# Altium integrated library 方林_Library.IntLib: 138 symbols (part 1 of 2)
Pins are listed as number, name and electrical type; pins without a type are passive.

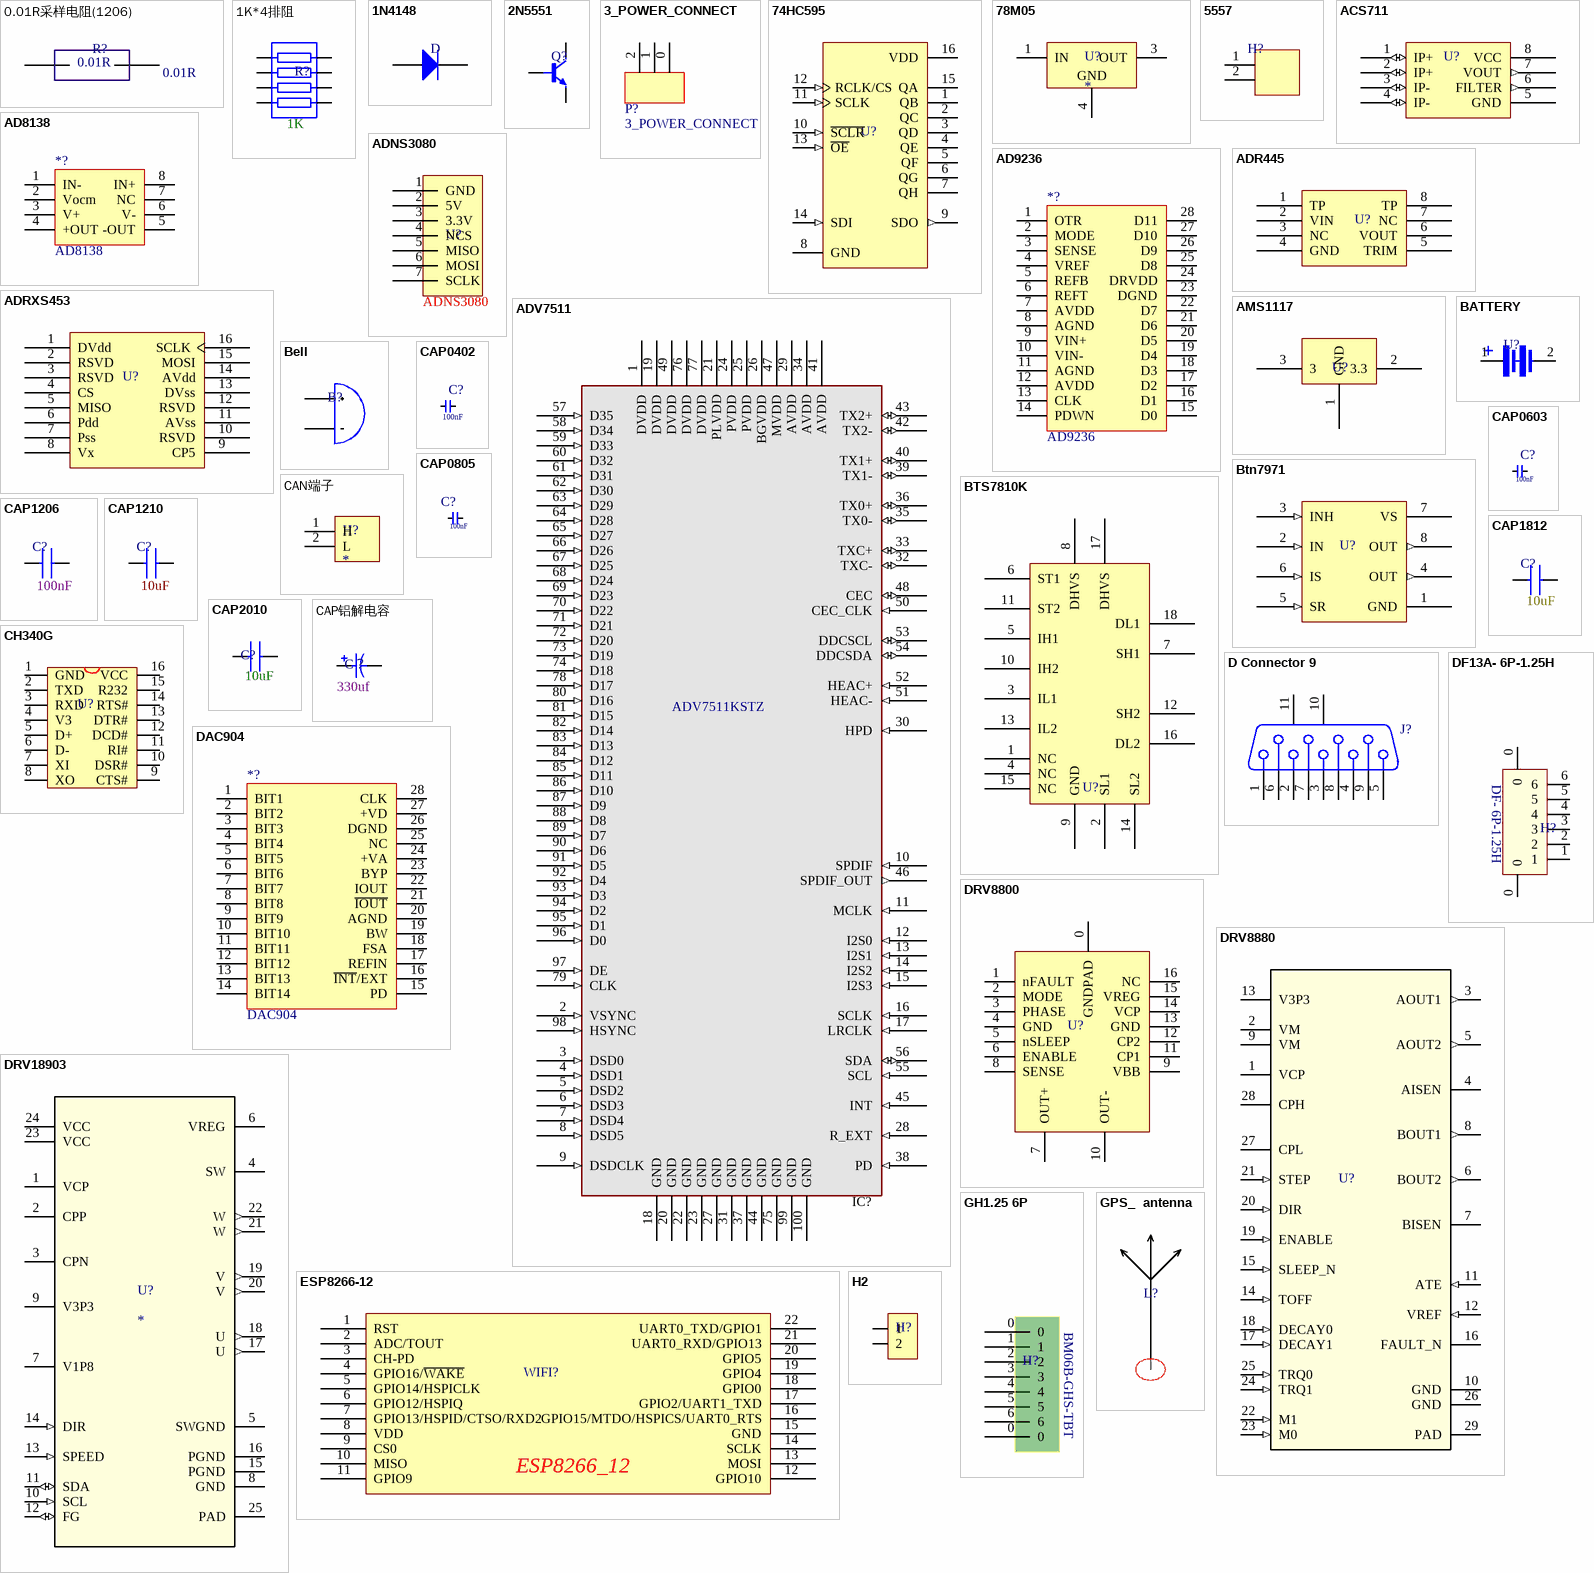
[diagram p0: symbols 0.01R采样电阻(1206) to H2]

## 0.01R采样电阻(1206)
designator R?  value 0.01R  (hidden comment: *)
采样电阻
footprint CAP1206
pins: 1, 2

## 1K*4排阻
designator R?  value 1K  (hidden comment: *)
footprint 1K*4排阻
pins: 1, 2, 3, 4, 5, 6, 7, 8

## 1N4148
designator D  (value not drawn)
footprint 1N4148
pins: 1 A, 2 K

## 2N5551
designator Q?  (value not drawn)
NPN三极管
footprint 2N5551
pins: 1 b, 2 e, 3 c

## 3_POWER_CONNECT
designator P?
footprint 4 pin white
pins: 0, 1, 2

## 74HC595
designator U?  (value not drawn)
锁存器
footprint TSSOP16
pins: 1 QB (hiz), 2 QC (hiz), 3 QD (hiz), 4 QE (hiz), 5 QF (hiz), 6 QG (hiz), 7 QH (hiz), 8 GND (power), 9 SDO (out), 10 ~{SCLR} (in), 11 SCLK (in), 12 RCLK/CS (in), 13 ~{OE} (in), 14 SDI (in), 15 QA (hiz), 16 VDD (power)

## 78M05
designator U?
5V稳压
footprint D-PAK
pins: 1 IN (power), 3 OUT (power), 4 GND (power)

## 5557
designator H?  (value not drawn)
footprint 5557
pins: 1, 2

## ACS711
designator U?  (value not drawn)
霍尔电流采样
footprint SOIC-NB-8
pins: 1 IP+ (io), 2 IP+ (io), 3 IP- (io), 4 IP- (io), 5 GND (power), 6 FILTER (out), 7 VOUT (out), 8 VCC (power)

## AD8138
designator *?
footprint SO-8
pins: 1 IN-, 2 Vocm, 3 V+, 4 +OUT, 5 -OUT, 6 V-, 7 NC, 8 IN+

## AD9236
designator *?
footprint SSOP-28 (FT232)
pins: 1 OTR, 2 MODE, 3 SENSE, 4 VREF, 5 REFB, 6 REFT, 7 AVDD, 8 AGND, 9 VIN+, 10 VIN-, 11 AGND, 12 AVDD, 13 CLK, 14 PDWN, 15 D0, 16 D1, 17 D2, 18 D3, 19 D4, 20 D5, 21 D6, 22 D7, 23 DGND, 24 DRVDD, 25 D8, 26 D9, 27 D10, 28 D11

## ADNS3080
designator U?  (value not drawn)
光流
footprint ADNS3080 (光流)
pins: 1 GND, 2 5V, 3 3.3V, 4 NCS, 5 MISO, 6 MOSI, 7 SCLK

## ADR445
designator U?  (value not drawn)
footprint SOIC-8
pins: 1 TP, 2 VIN, 3 NC, 4 GND, 5 TRIM, 6 VOUT, 7 NC, 8 TP

## ADRXS453
designator U?  (value not drawn)
footprint ADRXS453
pins: 1 DVdd, 2 RSVD, 3 RSVD, 4 CS, 5 MISO, 6 Pdd, 7 Pss, 8 Vx, 9 CP5, 10 RSVD, 11 AVss, 12 RSVD, 13 DVss, 14 AVdd, 15 MOSI, 16 SCLK

## ADV7511
designator IC?, comment ADV7511KSTZ
Low-Power HDMI Transmitter with Audio Return Channel; Manufacturer: Analog Devices; Value: 225MHz; DPN: *
footprint LQFP_100P
pins: 1 DVDD (power), 2 VSYNC (in), 3 DSD0 (in), 4 DSD1 (in), 5 DSD2 (in), 6 DSD3 (in), 7 DSD4 (in), 8 DSD5 (in), 9 DSDCLK (in), 10 SPDIF (in), 11 MCLK (in), 12 I2S0 (in), 13 I2S1 (in), 14 I2S2 (in), 15 I2S3 (in), 16 SCLK (in), 17 LRCLK (in), 18 GND (power), 19 DVDD (power), 20 GND (power), 21 PLVDD (power), 22 GND (power), 23 GND (power), 24 PVDD (power), 25 PVDD (power), 26 BGVDD (power), 27 GND (power), 28 R_EXT (in), 29 AVDD (power), 30 HPD (in), 31 GND (power), 32 TXC- (io), 33 TXC+ (io), 34 AVDD (power), 35 TX0- (io), 36 TX0+ (io), 37 GND (power), 38 PD (in), 39 TX1- (io), 40 TX1+ (io), 41 AVDD (power), 42 TX2- (io), 43 TX2+ (io), 44 GND (power), 45 INT (in), 46 SPDIF_OUT (out), 47 MVDD (power), 48 CEC (io), 49 DVDD (power), 50 CEC_CLK (in), 51 HEAC- (in), 52 HEAC+ (in), 53 DDCSCL (io), 54 DDCSDA (io), 55 SCL (in), 56 SDA (io), 57 D35 (in), 58 D34 (in), 59 D33 (in), 60 D32 (in), 61 D31 (in), 62 D30 (in), 63 D29 (in), 64 D28 (in), 65 D27 (in), 66 D26 (in), 67 D25 (in), 68 D24 (in), 69 D23 (in), 70 D22 (in), 71 D21 (in), 72 D20 (in), 73 D19 (in), 74 D18 (in), 75 GND (power), 76 DVDD (power), 77 DVDD (power), 78 D17 (in), 79 CLK (in), 80 D16 (in), 81 D15 (in), 82 D14 (in), 83 D13 (in), 84 D12 (in), 85 D11 (in), 86 D10 (in), 87 D9 (in), 88 D8 (in), 89 D7 (in), 90 D6 (in), 91 D5 (in), 92 D4 (in), 93 D3 (in), 94 D2 (in), 95 D1 (in), 96 D0 (in), 97 DE (in), 98 HSYNC (in), 99 GND (power), 100 GND (power)

## AMS1117
designator U?  (value not drawn)
3.3V稳压电源
footprint AMS1117
pins: 1 GND, 2 3.3, 3

## BATTERY
designator U?  (value not drawn)
纽扣电池
footprint BATTERY
pins: 1 +, 2 -

## Bell
designator B?  (value not drawn)
蜂鸣器
footprint BELL11.9
footprint Bell9.2
pins: 1 A, 2 B

## Btn7971
designator U?  (value not drawn)
半桥驱动
footprint TO263-7-1
pins: 1 GND (power), 2 IN (in), 3 INH (in), 4 OUT (out), 5 SR (in), 6 IS (in), 7 VS (power), 8 OUT (out)

## BTS7810K
designator U?  (value not drawn)
全桥驱动
footprint TO263-15-1
pins: 1 NC, 2 SL1, 3 IL1, 4 NC, 5 IH1, 6 ST1, 7 SH1, 8 DHVS, 9 GND, 10 IH2, 11 ST2, 12 SH2, 13 IL2, 14 SL2, 15 NC, 16 DL2, 17 DHVS, 18 DL1

## CAN端子
designator H?
footprint CAN端子
pins: 1 H, 2 L

## CAP0402
designator C?, comment 100nF
Value: 100nF
footprint CAP0402
pins: 1, 2

## CAP0603
designator C?, comment 100nF
Value: 100nF
footprint CAP0603
pins: 1, 2

## CAP0805
designator C?, comment 100nF
Value: 100nF
footprint CAP0805
pins: 1, 2

## CAP1206
designator C?, comment 100nF
Value: 100nF
footprint CAP1206
pins: 1, 2

## CAP1210
designator C?, comment 10uF
Value: 10uF
footprint CAP1210
pins: 1, 2

## CAP1812
designator C?, comment 10uF
Value: 10uF
footprint CAP1812
pins: 1, 2

## CAP2010
designator C?, comment 10uF
Value: 10uF
footprint CAP2010
pins: 1, 2

## CAP铝解电容
designator C？, comment 330uf
Value: 330uf
footprint CAP铝解电容
pins: 1, 2

## CH340G
designator U?  (value not drawn)
usb转串口
footprint SOIC-16
pins: 1 GND, 2 TXD, 3 RXD, 4 V3, 5 D+, 6 D-, 7 XI, 8 XO, 9 CTS#, 10 DSR#, 11 RI#, 12 DCD#, 13 DTR#, 14 RTS#, 15 R232, 16 VCC

## D Connector 9
designator J?
Receptacle Assembly, 9 Position, Right Angle; PackageDocument: O; Positions: 9; Published: 15-Jun-2001; LatestRevisionDate: 17-Jul-2002; LatestRevisionNote: Re-released for DXP Platform.; DatasheetDocument: 1-Sep-1999; PackageReference: 788750; Publisher: Altium Limited; Orientation: Right Angle; Gender: Receptacle
footprint DSUB1.385-2H9 (Connector; D Subminiature; 9 Position; Right Angle; Pitch 1.385 mm)
signal-integrity model Connector
pins: 1, 2, 3, 4, 5, 6, 7, 8, 9, 10 MH1, 11 MH2

## DAC904
designator *?
footprint SSOP-28 (FT232)
pins: 1 BIT1, 2 BIT2, 3 BIT3, 4 BIT4, 5 BIT5, 6 BIT6, 7 BIT7, 8 BIT8, 9 BIT9, 10 BIT10, 11 BIT11, 12 BIT12, 13 BIT13, 14 BIT14, 15 PD, 16 ~{INT}/EXT, 17 REFIN, 18 FSA, 19 BW, 20 AGND, 21 ~{IOUT}, 22 IOUT, 23 BYP, 24 +VA, 25 NC, 26 DGND, 27 +VD, 28 CLK

## DF13A- 6P-1.25H
designator H?  (value not drawn)
接插件
footprint DF13A- 6P-1.25H (接插件)
pins: 0, 0, 1, 2, 3, 4, 5, 6
text: DF- 6P-1.25H

## DRV8800
designator U?  (value not drawn)
直流电机驱动
footprint HTSSOP16
pins: 0 GNDPAD, 1 nFAULT, 2 MODE, 3 PHASE, 4 GND, 5 nSLEEP, 6 ENABLE, 7 OUT+, 8 SENSE, 9 VBB, 10 OUT-, 11 CP1, 12 CP2, 13 GND, 14 VCP, 15 VREG, 16 NC

## DRV8880
designator U?  (value not drawn)
步进电机驱动
footprint R-PWQFN-N28
pins: 1 VCP, 2 VM (power), 3 AOUT1 (out), 4 AISEN, 5 AOUT2 (out), 6 BOUT2 (out), 7 BISEN, 8 BOUT1 (out), 9 VM (power), 10 GND (power), 11 ATE (in), 12 VREF (in), 13 V3P3 (power), 14 TOFF (in), 15 SLEEP_N (in), 16 FAULT_N (oc), 17 DECAY1 (in), 18 DECAY0 (in), 19 ENABLE (in), 20 DIR (in), 21 STEP (in), 22 M1 (in), 23 M0 (in), 24 TRQ1 (in), 25 TRQ0 (in), 26 GND (power), 27 CPL, 28 CPH, 29 PAD (power)

## DRV18903
designator U?
无刷电机驱动
footprint HTSSOP24
pins: 1 VCP (power), 2 CPP (power), 3 CPN (power), 4 SW (power), 5 SWGND (power), 6 VREG (power), 7 V1P8 (power), 8 GND (power), 9 V3P3 (power), 10 SCL (in), 11 SDA (io), 12 FG (io), 13 SPEED (in), 14 DIR (in), 15 PGND (power), 16 PGND (power), 17 U (out), 18 U (out), 19 V (out), 20 V (out), 21 W (out), 22 W (out), 23 VCC (power), 24 VCC (power), 25 PAD (power)

## ESP8266-12
designator WIFI?  (value not drawn)
footprint ESP8266-12
pins: 1 RST, 2 ADC/TOUT, 3 CH-PD, 4 GPIO16/~{WAKE}, 5 GPIO14/HSPICLK, 6 GPIO12/HSPIQ, 7 GPIO13/HSPID/CTSO/RXD2, 8 VDD, 9 CS0, 10 MISO, 11 GPIO9, 12 GPIO10, 13 MOSI, 14 SCLK, 15 GND, 16 GPIO15/MTDO/HSPICS/UART0_RTS, 17 GPIO2/UART1_TXD, 18 GPIO0, 19 GPIO4, 20 GPIO5, 21 UART0_RXD/GPIO13, 22 UART0_TXD/GPIO1
text: ESP8266_12

## GH1.25 6P
designator H?  (value not drawn)
footprint GH1.25 6P
pins: 0, 0, 1, 2, 3, 4, 5, 6
text: BM06B-GHS-TBT

## GPS_  antenna
designator L?  (value not drawn)
GPS无源陶瓷天线
footprint GPS_  antenna (GPS无源陶瓷天线2)
pins: 1

## H2
designator H?  (value not drawn)
排针
footprint H2 (排针)
footprint XH2.54-2P (小白头)
pins: 1, 2

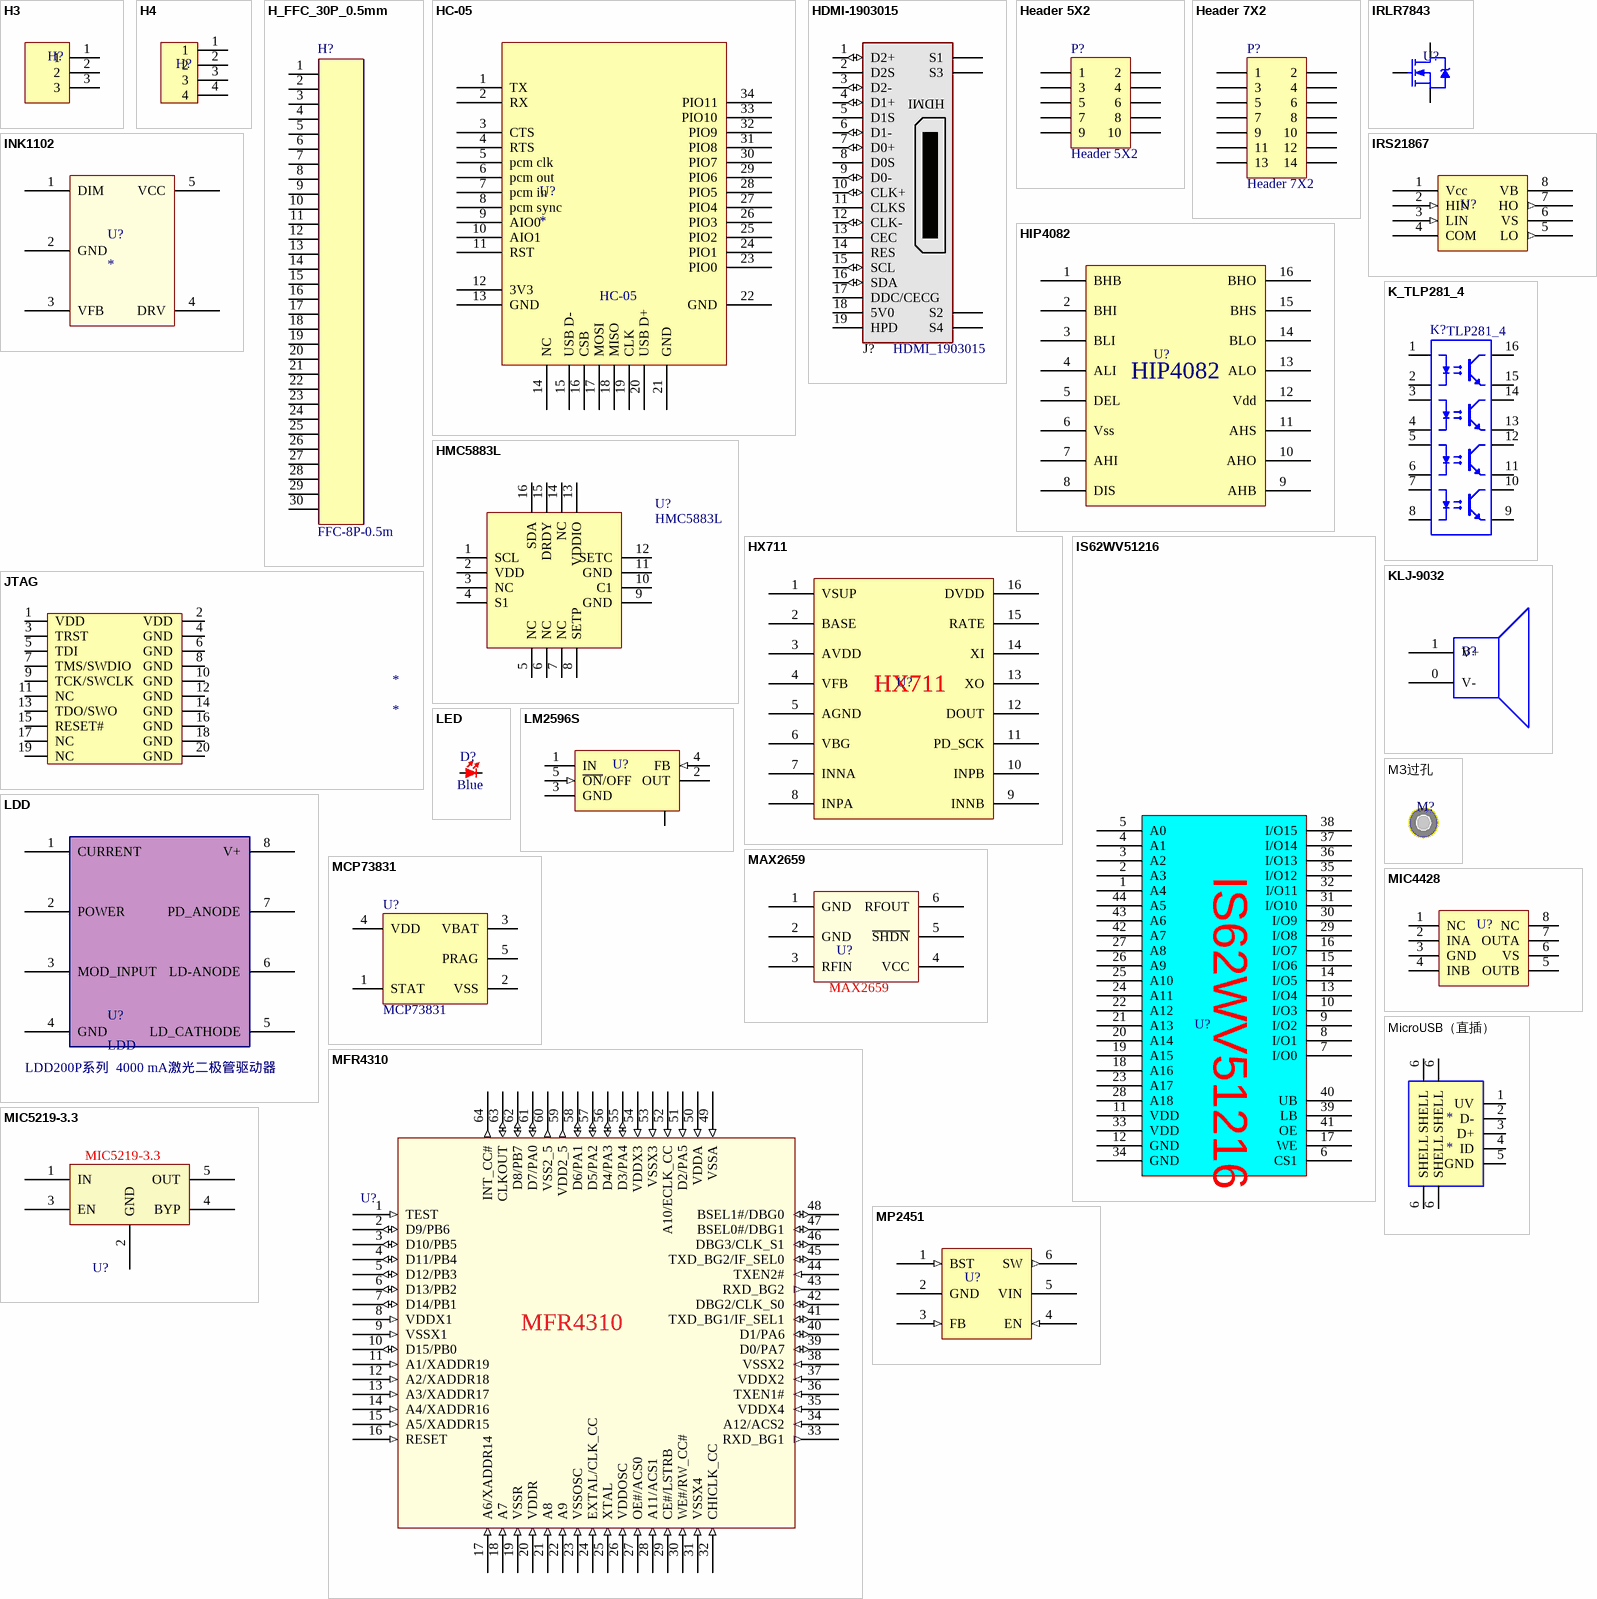
[diagram p1: symbols H3 to MP2451]

## H3
designator H?  (value not drawn)
排针
footprint H3 (排针)
footprint XH2.54-3P (小白头)
pins: 1, 2, 3

## H4
designator H?  (value not drawn)
排针
footprint H4 (排针)
footprint XH2.54-4P (小白头)
pins: 1, 2, 3, 4

## H_FFC_30P_0.5mm
designator H?, comment FFC-8P-0.5m
footprint H_FFC-30P-0.5 (间距0.5mm 30P)
pins: 1, 2, 3, 4, 5, 6, 7, 8, 9, 10, 11, 12, 13, 14, 15, 16, 17, 18, 19, 20, 21, 22, 23, 24, 25, 26, 27, 28, 29, 30

## HC-05
designator U?
蓝牙
footprint HC-05
pins: 1 TX, 2 RX, 3 CTS, 4 RTS, 5 pcm clk, 6 pcm out, 7 pcm in, 8 pcm sync, 9 AIO0, 10 AIO1, 11 RST, 12 3V3, 13 GND, 14 NC, 15 USB D-, 16 CSB, 17 MOSI, 18 MISO, 19 CLK, 20 USB D+, 21 GND, 22 GND, 23 PIO0, 24 PIO1, 25 PIO2, 26 PIO3, 27 PIO4, 28 PIO5, 29 PIO6, 30 PIO7, 31 PIO8, 32 PIO9, 33 PIO10, 34 PIO11

## HDMI-1903015
designator J?, comment HDMI_1903015
HDMI 1903015, 19 Pin Edge Connector with Shield, (Molex); Manufacturer: Tyco Electronics; DPN: *
footprint HDMI_1903015 (Tyco Electronics 1903015 HDMI, 19 Pin, Shielded Connector)
footprint HDMI_1903015
pins: 1 D2+ (io), 2 D2S, 3 D2- (io), 4 D1+ (io), 5 D1S, 6 D1- (io), 7 D0+ (io), 8 D0S, 9 D0- (io), 10 CLK+ (io), 11 CLKS, 12 CLK- (io), 13 CEC, 14 RES, 15 SCL (io), 16 SDA (io), 17 DDC/CECG, 18 5V0 (power), 19 HPD, S1, S2, S3, S4
text: HDMI

## Header 5X2
designator P?
Header, 5-Pin, Dual row; LatestRevisionDate: 17-Jul-2002; LatestRevisionNote: Re-released for DXP Platform.; Publisher: Altium Limited
footprint HDR2X5 (Connector; Header; 5x2 Position)
signal-integrity model Connector
pins: 1, 2, 3, 4, 5, 6, 7, 8, 9, 10

## Header 7X2
designator P?
Header, 7-Pin, Dual row; LatestRevisionDate: 17-Jul-2002; LatestRevisionNote: Re-released for DXP Platform.; Publisher: Altium Limited
signal-integrity model Connector
footprint JATG14
pins: 1, 2, 3, 4, 5, 6, 7, 8, 9, 10, 11, 12, 13, 14

## HIP4082
designator U?  (value not drawn)
MOS驱动
footprint SOIC-16
pins: 1 BHB, 2 BHI, 3 BLI, 4 ALI, 5 DEL, 6 Vss, 7 AHI, 8 DIS, 9 AHB, 10 AHO, 11 AHS, 12 Vdd, 13 ALO, 14 BLO, 15 BHS, 16 BHO

## HMC5883L
designator U?
footprint HMC5883L (QFN, 16-Leads, Body 3.0x3.0mm (max), Pitch 0.50mm, IPC Medium Density)
pins: 1 SCL, 2 VDD, 3 NC, 4 S1, 5 NC, 6 NC, 7 NC, 8 SETP, 9 GND, 10 C1, 11 GND, 12 SETC, 13 VDDIO, 14 NC, 15 DRDY, 16 SDA

## HX711
designator U?  (value not drawn)
电子秤专用模拟/数字（A/D）转换器芯片
footprint SOP-16
pins: 1 VSUP, 2 BASE, 3 AVDD, 4 VFB, 5 AGND, 6 VBG, 7 INNA, 8 INPA, 9 INNB, 10 INPB, 11 PD_SCK, 12 DOUT, 13 XO, 14 XI, 15 RATE, 16 DVDD

## INK1102
designator U?
footprint INK1102
pins: 1 DIM, 2 GND, 3 VFB, 4 DRV, 5 VCC

## IRLR7843
designator U?  (value not drawn)
N-MOS
footprint D-PAK
pins: 1 G, 3 S, 4 D

## IRS21867
designator U?  (value not drawn)
footprint SOIC-8
pins: 1 Vcc (power), 2 HIN (in), 3 LIN (in), 4 COM (power), 5 LO (out), 6 VS (power), 7 HO (out), 8 VB (power)

## IS62WV51216
designator U?  (value not drawn)
外部SRAM
footprint TSOP-44
pins: 1 A4, 2 A3, 3 A2, 4 A1, 5 A0, 6 CS1, 7 I/O0, 8 I/O1, 9 I/O2, 10 I/O3, 11 VDD, 12 GND, 13 I/O4, 14 I/O5, 15 I/O6, 16 I/O7, 17 WE, 18 A16, 19 A15, 20 A14, 21 A13, 22 A12, 23 A17, 24 A11, 25 A10, 26 A9, 27 A8, 28 A18, 29 I/O8, 30 I/O9, 31 I/O10, 32 I/O11, 33 VDD, 34 GND, 35 I/O12, 36 I/O13, 37 I/O14, 38 I/O15, 39 LB, 40 UB, 41 OE, 42 A7, 43 A6, 44 A5

## JTAG
designator *
footprint JTAG
pins: 1 VDD, 2 VDD, 3 TRST, 4 GND, 5 TDI, 6 GND, 7 TMS/SWDIO, 8 GND, 9 TCK/SWCLK, 10 GND, 11 NC, 12 GND, 13 TDO/SWO, 14 GND, 15 RESET#, 16 GND, 17 NC, 18 GND, 19 NC, 20 GND

## K_TLP281_4
designator K?, comment TLP281_4
4通道贴片光耦
footprint TLP521-4
pins: 1 A "Anode", 2 K "Cathode", 3 A "Anode", 4 K "Cathode", 5 A "Anode", 6 K "Cathode", 7 A "Anode", 8 K "Cathode", 9 E "Emitter", 10 C "Collector", 11 E "Emitter", 12 C "Collector", 13 E "Emitter", 14 C "Collector", 15 E "Emitter", 16 C "Collector"

## KLJ-9032
designator B?  (value not drawn)
贴片蜂鸣器
footprint KLJ-9032
pins: 0 V- (power), 1 V+ (power)

## LDD
designator U?
LDD200P系列  200 mA激光二极管驱动器
footprint LDD (LDD P Series Laser Diode Driver)
pins: 1 CURRENT, 2 POWER, 3 MOD_INPUT, 4 GND, 5 LD_CATHODE, 6 LD-ANODE, 7 PD_ANODE, 8 V+
text: LDD200P系列  4000 mA激光二极管驱动器

## LED
designator D?  Color: Blue  (hidden comment: *)
footprint LED
footprint LED_0603_R
footprint LED_0603_G
footprint LED_0603_B
pins: 1, 2

## LM2596S
designator U?  (value not drawn)
开关稳压芯片
footprint TO263-5-1
pins: 1 IN (power), 2 OUT (power), 3 GND (power), 4 FB (in), 5 ~{ON}/OFF (in), 6 (power)

## M3过孔
designator M?  (value not drawn)
footprint M3过孔

## MAX2659
designator U?  (value not drawn)
GPS放大器
footprint 6μDFN
pins: 1 GND, 2 GND, 3 RFIN, 4 VCC, 5 ~{SHDN}, 6 RFOUT

## MCP73831
designator U?
footprint SOT-23-5
pins: 1 STAT, 2 VSS, 3 VBAT, 4 VDD, 5 PRAG

## MFR4310
designator U?  (value not drawn)
Flexray通讯控制器(CC)
footprint LQFP_64P
pins: 1 TEST (in), 2 D9/PB6 (io), 3 D10/PB5 (io), 4 D11/PB4 (io), 5 D12/PB3 (io), 6 D13/PB2 (io), 7 D14/PB1 (io), 8 VDDX1 (in), 9 VSSX1 (in), 10 D15/PB0 (io), 11 A1/XADDR19 (in), 12 A2/XADDR18 (in), 13 A3/XADDR17 (in), 14 A4/XADDR16 (in), 15 A5/XADDR15 (in), 16 RESET (in), 17 A6/XADDR14 (in), 18 A7 (in), 19 VSSR (in), 20 VDDR (in), 21 A8 (in), 22 A9 (in), 23 VSSOSC (in), 24 EXTAL/CLK_CC (in), 25 XTAL (in), 26 VDDOSC (in), 27 OE#/ACS0 (in), 28 A11/ACS1 (in), 29 CE#/LSTRB (in), 30 WE#/RW_CC# (in), 31 VSSX4 (in), 32 CHICLK_CC (in), 33 RXD_BG1 (out), 34 A12/ACS2 (in), 35 VDDX4 (in), 36 TXEN1# (in), 37 VDDX2 (in), 38 VSSX2 (in), 39 D0/PA7 (io), 40 D1/PA6 (io), 41 TXD_BG1/IF_SEL1 (io), 42 DBG2/CLK_S0 (io), 43 RXD_BG2 (out), 44 TXEN2# (in), 45 TXD_BG2/IF_SEL0 (io), 46 DBG3/CLK_S1 (io), 47 BSEL0#/DBG1 (io), 48 BSEL1#/DBG0 (io), 49 VSSA (in), 50 VDDA (in), 51 D2/PA5 (in), 52 A10/ECLK_CC (in), 53 VSSX3 (in), 54 VDDX3 (in), 55 D3/PA4 (io), 56 D4/PA3 (io), 57 D5/PA2 (io), 58 D6/PA1 (io), 59 VDD2_5 (out), 60 VSS2_5 (out), 61 D7/PA0 (io), 62 D8/PB7 (io), 63 CLKOUT (io), 64 INT_CC# (out)

## MIC4428
designator U?  (value not drawn)
缓冲器
footprint SOIC-NB-8
pins: 1 NC, 2 INA, 3 GND, 4 INB, 5 OUTB, 6 VS, 7 OUTA, 8 NC

## MIC5219-3.3
designator U?  (value not drawn)
线性稳压器
footprint SOT23-5
pins: 1 IN (power), 2 GND, 3 EN, 4 BYP, 5 OUT

## MicroUSB（直插）
designator *
footprint MINI  USB
footprint MicroUSB（直插）
footprint Micro USB
pins: 1 UV, 2 D-, 3 D+, 4 ID, 5 GND, 6 SHELL, 6 SHELL, 6 SHELL, 6 SHELL

## MP2451
designator U?  (value not drawn)
footprint SOT23-6
pins: 1 BST (in), 2 GND (power), 3 FB (in), 4 EN (in), 5 VIN (power), 6 SW (out)
